# Altium footprint library Capacitors.PcbLib: 240 footprints (part 12 of 15)
Each footprint in its own frame and in the unit in brackets; x right, y up, seen from the top. Pads: shape width x height; smd on the part's side, far side on the other; paste and mask are expansions set on the pad; w line width, h text height; cw(c..) or ccw(c..) is an arc to the next point about the centre after c.
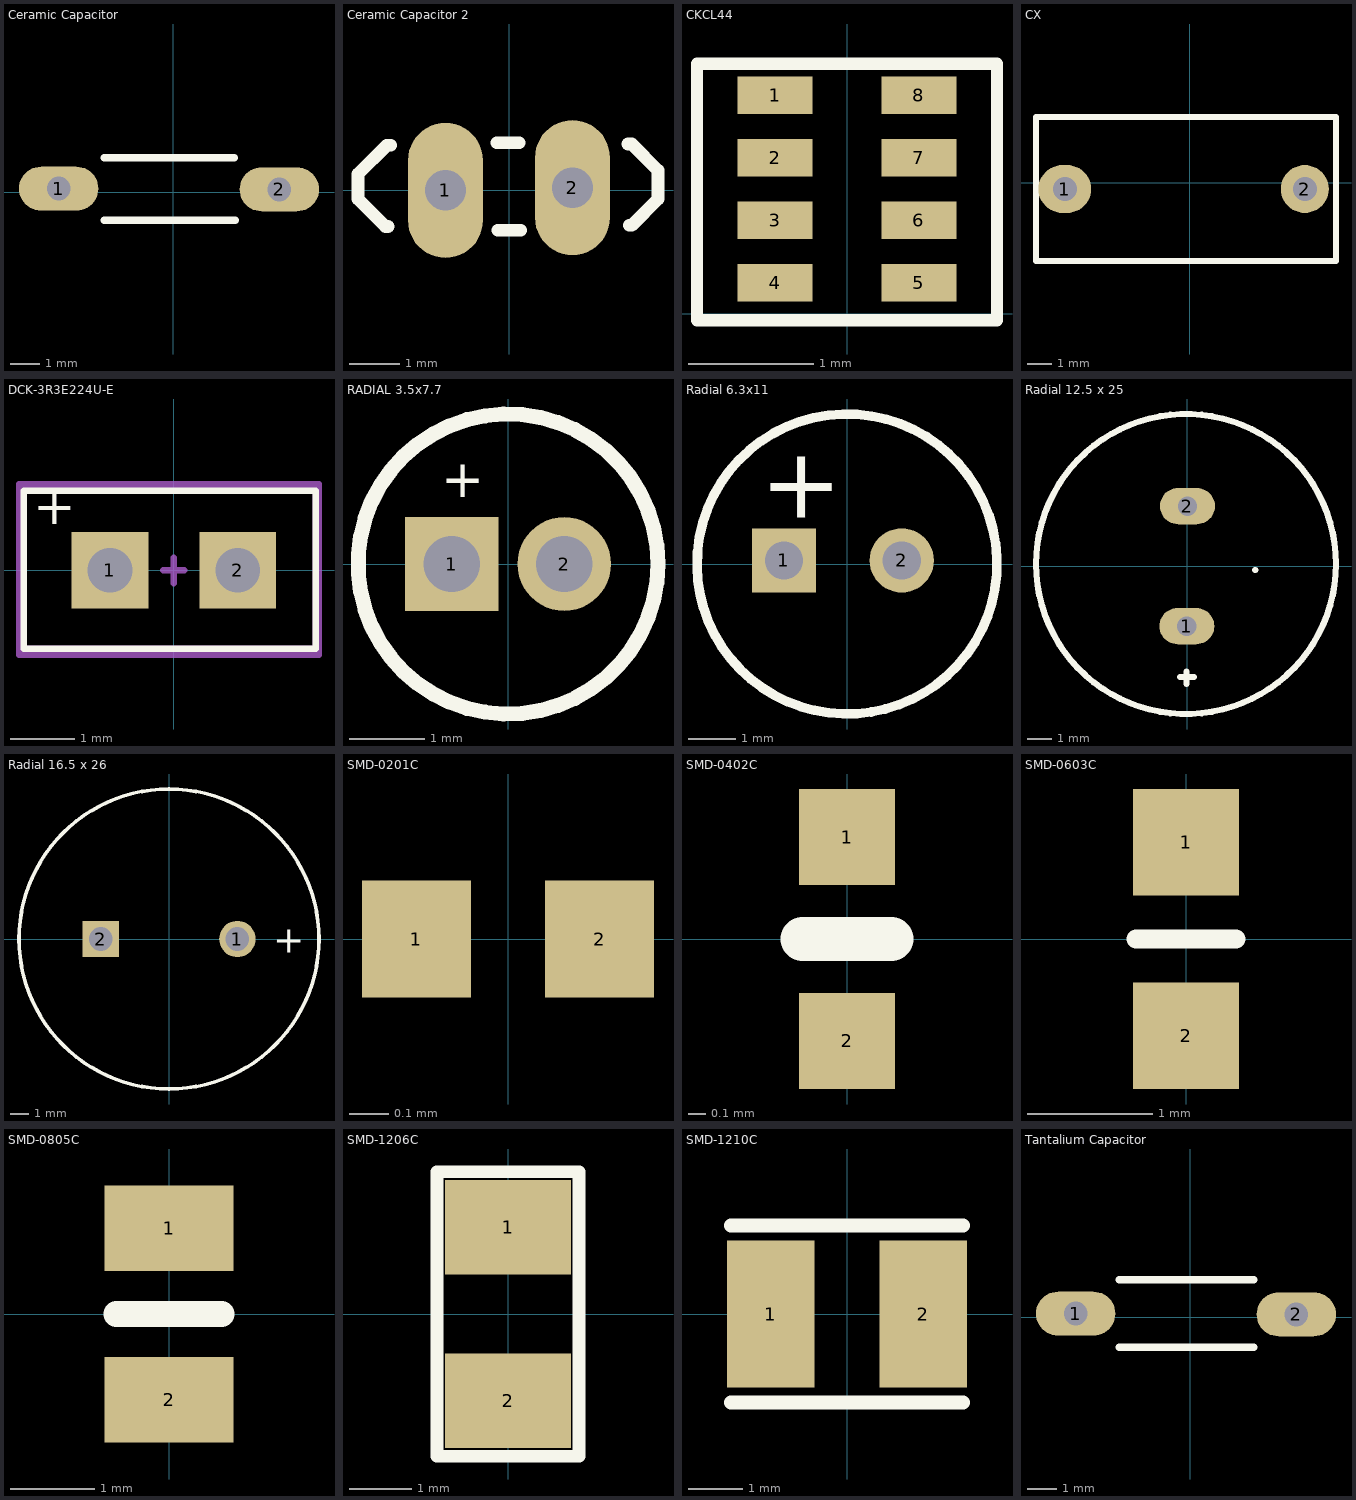
[diagram p11: the footprints below, top view; thin cyan lines are the x and y axes]

## Ceramic Capacitor [mm] "Capacitor ceramico tipo lenteja"
pads (2):
  oval 2.7x1.5 hole 0.813: 1(-3.9,0.125) 2(3.6,0.1)
Top Overlay:
  lines w0.254: -2.35,-0.95 2.1,-0.95 ; -2.35,1.175 2.075,1.175
3D body "ceramico.STEP": height 9.13, standoff -1.05, extent -4.15,-1.05 3.851,1.339

## Ceramic Capacitor 2 [mm] "CAPACITOR CERAMICO"
pads (2):
  oval 1.5x2.7 hole 0.813: 1(-1.276,0) 2(1.264,0.054)
Top Overlay:
  lines w0.254: -2.425,-0.725 -2.475,-0.725 -3.025,-0.175 -3.025,0.075 -3.025,0.325 -2.45,0.9 -2.375,0.9 ; -0.25,0.95 0.2,0.95 ; -0.225,-0.8 0.225,-0.8 ; 2.375,0.925 2.45,0.925 2.975,0.4 2.975,-0.025 2.975,-0.175 2.45,-0.7 2.4,-0.7
3D body "Cap 100n.step": height 6.92, standoff -1, extent -2.925,-0.735 2.913,0.961

## CKCL44 [mm]
pads (8):
  rect 0.6x0.3 smd: 1(-0.575,1.75) 2(-0.575,1.25) 3(-0.575,0.75) 4(-0.575,0.25) 5(0.575,0.25) 6(0.575,0.75) 7(0.575,1.25) 8(0.575,1.75)
Top Overlay:
  lines w0.1: -1.2,-0.05 -1.2,2 1.2,2 1.2,-0.05 -1.2,-0.05

## CX [mm]
pads (2):
  oval 2.2x2 hole 1: 1(-5.207,-0.254)
  round 2 hole 1: 2(4.793,-0.254)
Top Overlay:
  lines w0.254: -6.407,2.746 -6.407,-3.254 6.093,-3.254 6.093,2.746 -4.007,2.746 -6.362,2.746
3D body "Body.STEP": height 12, standoff 0, extent -6.627,-3.333 6.373,2.667

## DCK-3R3E224U-E [mm] "Empaque SMD0403 Azul"
pads (2):
  rect 1.2x1.2 hole 0.7 square: 1(-1,0) 2(1,0)
Top Overlay:
  lines w0.1: -2.35,-1.225 -0.025,-1.225 2.225,-1.225 2.225,1.25 0,1.25 -2.35,1.25 -2.35,-1.225
  text "+" at -2.2,0.525 h1
Mechanical 1:
  lines w0.1: -2.425,-1.325 2.275,-1.325 2.275,1.35 -2.425,1.35 -2.425,-1.325
  text ".Designator" at -1.9,-1.15 h0.8
Mechanical 15:
  lines w0.1: -0.165,0 0.165,0 ; 0,-0.2 0,0 0,0.2 ; 2.225,1.25 0,1.25 -2.35,1.25 -2.35,-1.225 -0.025,-1.225 2.225,-1.225 2.225,1.25 ; 2.225,1.25 2.225,1.25

## RADIAL 3.5x7.7 [mm] "Capacitor  Electrolitico Radial 3.5mm diametro  x 7.7mm de altura (1.5mm entre pines)"
height 6
pads (2):
  rect 1.25x1.25 hole 0.75: 1(-0.75,0)
  round 1.25 hole 0.75: 2(0.75,0)
Top Overlay:
  circle w0.2: c0,0 r2
  text "+" at -0.889,0.889 h0.5
3D body "C_ElLECTROLITICO_3.5x8_by_CharlyLex.STEP": height 8.53, standoff -1.72, extent -1.778,-1.778 1.773,1.773

## Radial 6.3x11 [mm] "Capacitor  Electrolitico Radial 6.3mm diametro  x 11mm de altura (2.5mm entre pines)"
height 12
pads (2):
  rect 1.35x1.35 hole 0.8: 1(-1.325,0.075)
  round 1.35 hole 0.8: 2(1.15,0.075)
Top Overlay:
  lines w0.2: -3.15,-0.052 ccw(c0,0) 3.149,0.076 ; -3.15,-0.05 cw(c0,0) 3.145,-0.172
  text "+" at -1.825,0.975 h1.5
3D body "SW3dPS-Cap electro 6.3x11x2.5mm.STEP": height 11.53, standoff -3.01, extent -3.273,-3.08 3.078,3.27

## Radial 12.5 x 25 [mm] "Capacitor  Electrolitico Radial 12.5mm diametro  x 25mm de altura (5mm entre pines)"
pads (2):
  oval 2.27x1.5 hole 0.8: 1(-0.012,-2.476) 2(0.013,2.477)
Top Overlay:
  circle w0.254: c-0.048,0.089 r6.188
  lines w0.254: -0.3,-4.575 0.275,-4.575 ; -0.025,-4.85 -0.025,-4.35 ; 2.808,-0.162 2.808,-0.162
3D body "Cap12_5x25.STEP": height 26.49, standoff -17.5, extent -6.235,-6.261 6.264,6.238

## Radial 16.5 x 26 [mm] "Capacitor  Electrolitico Radial 16.5mm diametro  x 26mm de altura (7.5mm entre pines)"
height 21.5
pads (2):
  round 2 hole 1.3: 1(3.75,0)
  rect 2x2 hole 1.3: 2(-3.75,0)
Top Overlay:
  circle w0.2: c0,0 r8.225
  text "+" at 5.715,-0.762 h1.5
3D body "SW3dPS-CAPACITOR-2.STEP": height 26, standoff -2.5, extent -8.264,-8.262 8.244,8.238

## SMD-0201C [mm] "SMD-0201"
height 0.25
pads (2):
  rect 0.28x0.3 smd: 1(-0.235,0) 2(0.235,0)
3D body "User Library-Chip Cap_MLCC_0201 (0603).step": height 0.3, standoff 0, extent -0.3,-0.152 0.3,0.148

## SMD-0402C [mm]
pads (2):
  rect 0.55x0.55 smd: 1(0,0.584) 2(0,-0.584)
Top Overlay:
  lines w0.254: -0.254,0 0.254,0
3D body "capacitor 0402.step": height 0.51, standoff 0, extent -0.254,-0.508 0.254,0.508

## SMD-0603C [mm]
pads (2):
  rect 0.85x0.85 smd: 1(0,0.775) 2(0,-0.775)
Top Overlay:
  lines w0.152: -0.4,0 0.4,0
3D body "capacitor 0603.step": height 0.9, standoff 0, extent -0.4,-0.8 0.4,0.8

## SMD-0805C [mil]
pads (2):
  rect 60x40 smd: 1(0,40) 2(0,-40)
Top Overlay:
  lines w12: -24.6,0.01 24.6,0.01
3D body "capacitor 0805.step": height 35.43, standoff 0, extent -24.6,-39.36 24.6,39.38

## SMD-1206C [mil]
pads (2):
  rect 80x60 smd: 1(0,55) 2(0,-55)
Top Overlay:
  lines w8: -45,-90 45,-90 45,90 -45,90 -45,-90
3D body "capacitor 1206.step": height 39.37, standoff 0, extent -31.49,-62.99 31.5,63

## SMD-1210C [mm]
height 0.5
pads (2):
  rect 1.6x2.7 smd: 1(-1.4,0) 2(1.4,0)
Top Overlay:
  lines w0.254: -2.125,-1.625 2.125,-1.625 ; -2.125,1.625 2.125,1.625
3D body "User Library-1210(3225M) Cap.step": height 1.7, standoff 0, extent -2,-1.219 2,1.27

## Tantalium Capacitor [mm] "Capacitor de tantalio tipo lenteja"
pads (2):
  oval 2.7x1.5 hole 0.813: 1(-3.9,0.125) 2(3.6,0.1)
Top Overlay:
  lines w0.254: -2.413,-1.016 2.159,-1.016 ; -2.413,1.27 2.159,1.27
3D body "Tantalio.STEP": height 9.13, standoff -1.05, extent -4.15,-1.05 3.851,1.339